# Altium schematic symbol library Analog Devices Data Converters Digital-to-Analog Converters.SchLib: 2231 symbols (part 114 of 135)
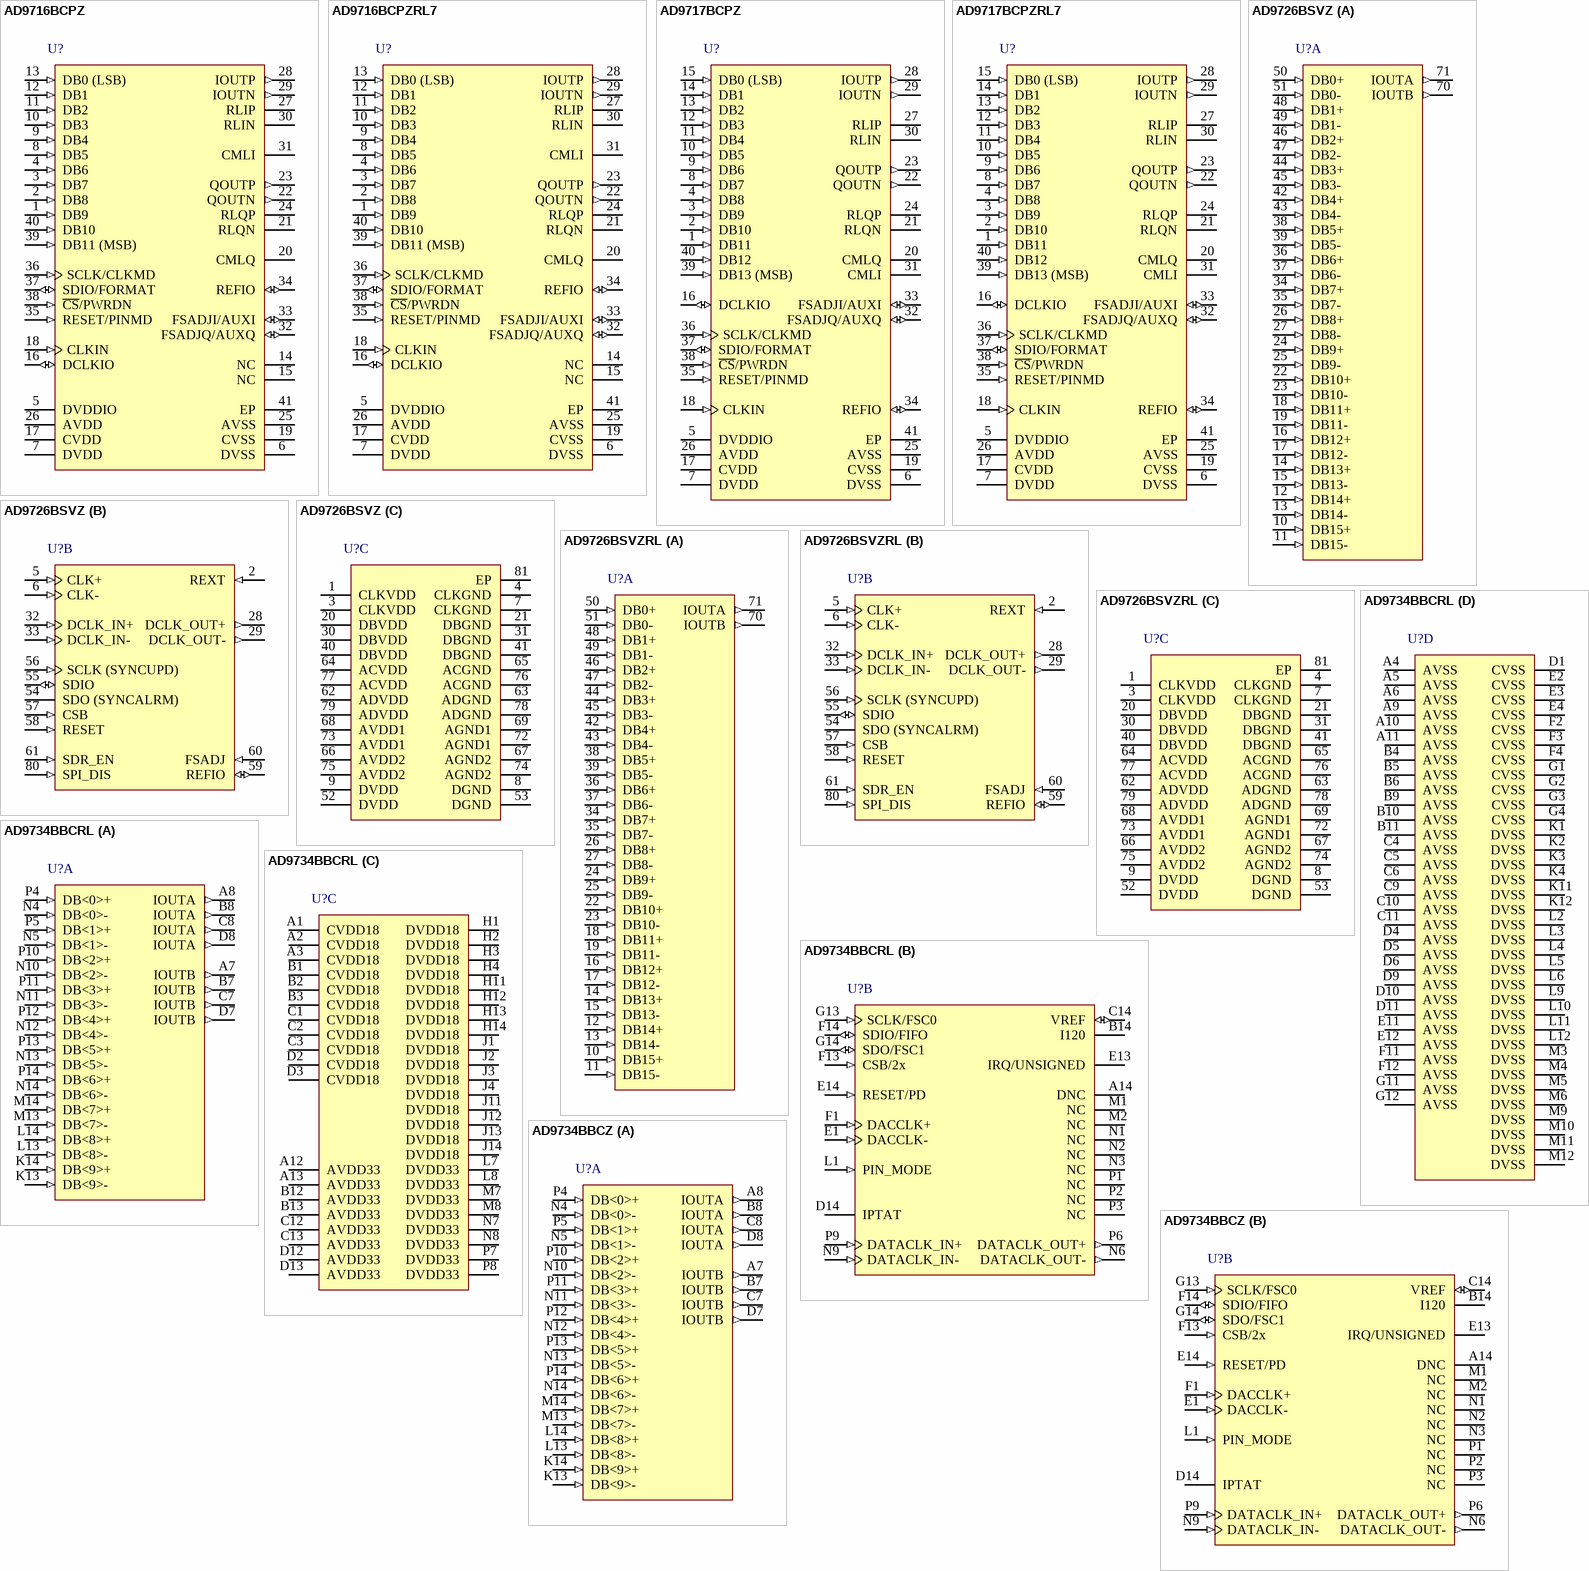
[diagram p226: symbols AD9716BCPZ to AD9734BBCZ]

## AD9717BCPZRL7
designator U?
Dual 14-Bit TxDAC, 0 to +70 degC, CP-40-1, Pb-Free, Reel; Generic Part Number: AD9717; Manufacturer: Analog Devices; PartNumber: AD9717BCPZRL7; # DAC Outputs: 2; Max V+: 3.3V; Resolution (Bits): 14; Single Supply: Yes; DatasheetVersion: Rev.A; PackageVersion: Oct-2006; PackageReference: CP-40-1; PackageDescription: 40-Pin Lead Frame Chip Scale Package [LFCSP_VQ] Very Thin Quad; Supplier 1: Digi-Key; Supplier Part Number 1: AD9717BCPZRL7-ND; Supplier 2: Newark; Supplier Part Number 2: 07P9010; Supplier 3: Mouser; Supplier Part Number 3: 584-AD9717BCPZR7; Packing: Reel; RoHS: Y; Mounting Technology: Surface Mount; Code_JEDEC: MO-220-VJJD-2; ComponentLink1Description: Manufacturer URL; ComponentLink1URL: http://www.analog.com/en/index.html; ComponentLink2Description: Datasheet; ComponentLink2URL: http://www.analog.com/static/imported-files/data_sheets/AD9714_9715_9716_9717.pdf; ComponentLink3Description: Package Specification; ComponentLink3URL: http://www.analog.com/static/imported-files/packages/PKG_PDF/LFCSP(CP)/CP_40_1.pdf; ComponentLink4Description: Product URL; ComponentLink4URL: http://www.analog.com/en/digital-to-analog-converters/da-converters/ad9717/products/product.html
footprint CP-40-1_N (QFN, 40-Leads, Body 6x6mm, Pitch 0.5mm, Thermal Pad 4.3x4.3mm, IPC Medium Density)
footprint CP-40-1_L (QFN, 40-Leads, Body 6x6mm, Pitch 0.5mm, Thermal Pad 4.3x4.3mm, IPC High Density)
footprint CP-40-1_M (QFN, 40-Leads, Body 6x6mm, Pitch 0.5mm, Thermal Pad 4.3x4.3mm, IPC Low Density)
pins: 1 DB11 (in) "Digital Input", 2 DB10 (in) "Digital Input", 3 DB9 (in) "Digital Input", 4 DB8 (in) "Digital Input", 5 DVDDIO (power) "Digital I/O Supply Voltage (1.8 V to 3.3 V Nominal).", 6 DVSS (power) "Digital Common.", 7 DVDD (power) "Digital Core Supply Voltage (1.8 V). Strap DVDD to DVDDIO at 1.8 V. If DVDDIO > 1.8 V, bypass DVDD with a 1.0 uF capacitor; however, do not otherwise connect it. The LDO should not drive external loads.", 8 DB7 (in) "Digital Input", 9 DB6 (in) "Digital Input", 10 DB5 (in) "Digital Input", 11 DB4 (in) "Digital Input", 12 DB3 (in) "Digital Input", 13 DB2 (in) "Digital Input", 14 DB1 (in) "Digital Input", 15 DB0 (LSB) (in) "Digital Input (LSB).", 16 DCLKIO (io) "Data Input/Output Clock. Clock used to qualify input data.", 17 CVDD (power) "Sampling Clock Supply Voltage (1.8 V to 3.3 V). CVDD must be >= DVDD.", 18 CLKIN (in) "LVCMOS Sampling Clock Input.", 19 CVSS (power) "Sampling Clock Supply Voltage Common.", 20 CMLQ "Q DAC Output Common-Mode Level. When the internal on chip (QRCML) is enabled, this pin is connected to the on-chip QRCML resistor. It is recommended to leave this pin unconnected. When the internal on chip (QRCML) is (See Datasheet)", 21 RLQN "Load Resistor (500 ohm) to the CMLQ Pin. For the internal load resistor to be used, this pin should be tied to QOUTN externally.", 22 QOUTN (out) "Complementary Q DAC Current Output. Full-scale current is sourced when all data bits are 0s.", 23 QOUTP (out) "Q DAC Current Output. Full-scale current is sourced when all data bits are 1s.", 24 RLQP "Load Resistor (500 ohm) to the CMLQ Pin. For the internal load resistor to be used, this pin should be tied to QOUTP externally.", 25 AVSS (power) "Analog Common.", 26 AVDD (power) "Analog Supply Voltage (1.8 V to 3.3 V).", 27 RLIP "Load Resistor (500 ohm) to the CMLI Pin. For the internal load resistor to be used, this pin should be tied to IOUTP externally.", 28 IOUTP (out) "I DAC Current Output. Full-scale current is sourced when all data bits are 1s.", 29 IOUTN (out) "Complementary I DAC Current Output. Full-scale current is sourced when all data bits are 0s.", 30 RLIN "Load Resistor (500 ohm) to the CMLI Pin. For the internal load resistor to be used, this pin should be tied to IOUTN externally.", 31 CMLI "I DAC Output Common-Mode Level. When the internal on chip (IRCML) is enabled, this pin is connected to the on-chip IRCML resistor. It is recommended to leave this pin unconnected. When the internal on chip (IRCML) is (See Datasheet)", 32 FSADJQ/AUXQ (io) "Full-Scale Current Output Adjust (FSADJQ). When the internal on chip (QRSET) is disabled, this pin is the full-scale current output adjust for Q DAC and must be connected to AVSS through a resistor (see the Theory of (See Datasheet)", 33 FSADJI/AUXI (io) "Full-Scale Current Output Adjust (FSADJI). When the internal on chip (IRSET) is disabled, this pin is the full-scale current output adjust for I DAC and must be connected to AVSS through a resistor (see the Theory of (See Datasheet)", 34 REFIO (io) "Reference Input/Output. Serves as a reference input when the internal reference is disabled. Provides a 1.0 V reference output when in internal reference mode (a 0.1 uF capacitor to AVSS is required).", 35 RESET/PINMD (in) "This pin defines the operation mode of the part. A logic low (pull-down to DVSS) sets the part in SPI mode. Pulse RESET high to reset the SPI registers to their default values. A logic high (pull-up to DVDDIO) puts the (See Datasheet)", 36 SCLK/CLKMD (in) "Clock Input for Serial Port (SCLK). In SPI mode, this pin is the clock input for the serial port. Clock Mode (CLKMD). In pin mode, CLKMD determines the phase of the internal retiming clock. When DCLKIO = CLKIN, tie it to 0. (See Datasheet)", 37 SDIO/FORMAT (io) "Serial Port Input/Output (SDIO). In SPI mode, this pin is the bidirectional data line for the serial port. Format Pin (FORMAT). In pin mode, FORMAT determines the data format of digital data. A logic low (pull-down to DVSS) (See Datasheet)", 38 ~{CS}/PWRDN (in) "Active Low Chip Select (C\S\). In SPI mode, this pin serves as the active low chip select. Power-Down (PWRDN). In pin mode, a logic high (pull-up to DVDDIO) powers down the device, except for the SPI port.", 39 DB13 (MSB) (in) "Digital Input (MSB).", 40 DB12 (in) "Digital Input", 41 EP (power) "The exposed pad is connected to AVSS and should be soldered to the ground plane. Exposed metal at the package corners is connected to this pad."

## AD9726BSVZ
designator U?
Single 16-Bit Digital-to-Analog Converter, -40 to +85 degC, SV-80-1, Pb-Free, Tray; Generic Part Number: AD9726; Manufacturer: Analog Devices; PartNumber: AD9726BSVZ; # DAC Outputs: 1; Max V+: 3.47V; Op Pwr Diss: 652mW; Resolution (Bits): 16; Settling Time: 10.5ns; Single Supply: No; DatasheetVersion: Rev.B; PackageVersion: Oct-2005; PackageReference: SV-80-1; PackageDescription: 80-Lead Thin Quad Flat Package, Exposed Pad [TQFP_EP]; Supplier 1: Digi-Key; Supplier Part Number 1: AD9726BSVZ-ND; Supplier 2: Farnell; Supplier Part Number 2: 1117883; Supplier 3: Newark; Supplier Part Number 3: 59K7323; Supplier 4: Mouser; Supplier Part Number 4: 584-AD9726BSVZ; Packing: Tray; RoHS: Y; Mounting Technology: Surface Mount; Code_JEDEC: MS-026-ADD-HD; ComponentLink1Description: Manufacturer URL; ComponentLink1URL: http://www.analog.com/en/index.html; ComponentLink2Description: Datasheet; ComponentLink2URL: http://www.analog.com/static/imported-files/data_sheets/AD9726.pdf; ComponentLink3Description: Package Specification; ComponentLink3URL: http://www.analog.com/static/imported-files/packages/3250240192292635369SV_80_1.pdf; ComponentLink4Description: Product URL; ComponentLink4URL: http://www.analog.com/en/digital-to-analog-converters/da-converters/ad9726/products/product.html
footprint SV-80-1_N (Thin QFP, 80-Leads, Body 12x12mm, Pitch 0.5mm, Thermal Pad 6x6mm, IPC Medium Density)
footprint SV-80-1_L (Thin QFP, 80-Leads, Body 12x12mm, Pitch 0.5mm, Thermal Pad 6x6mm, IPC High Density)
footprint SV-80-1_M (Thin QFP, 80-Leads, Body 12x12mm, Pitch 0.5mm, Thermal Pad 6x6mm, IPC Low Density)
part A pins: 10 DB15+ (in) "Data Bit 15 True", 11 DB15- (in) "Data Bit 15 Complement", 12 DB14+ (in) "Data Bit 14 True", 13 DB14- (in) "Data Bit 14 Complement", 14 DB13+ (in) "Data Bit 13 True", 15 DB13- (in) "Data Bit 13 Complement", 16 DB12+ (in) "Data Bit 12 True", 17 DB12- (in) "Data Bit 12 Complement", 18 DB11+ (in) "Data Bit 11 True", 19 DB11- (in) "Data Bit 11 Complement", 22 DB10+ (in) "Data Bit 10 True", 23 DB10- (in) "Data Bit 10 Complement", 24 DB9+ (in) "Data Bit 9 True", 25 DB9- (in) "Data Bit 9 Complement", 26 DB8+ (in) "Data Bit 8 True", 27 DB8- (in) "Data Bit 8 Complement", 34 DB7+ (in) "Data Bit 7 True", 35 DB7- (in) "Data Bit 7 Complement", 36 DB6+ (in) "Data Bit 6 True", 37 DB6- (in) "Data Bit 6 Complement", 38 DB5+ (in) "Data Bit 5 True", 39 DB5- (in) "Data Bit 5 Complement", 42 DB4+ (in) "Data Bit 4 True", 43 DB4- (in) "Data Bit 4 Complement", 44 DB3+ (in) "Data Bit 3 True", 45 DB3- (in) "Data Bit 3 Complement", 46 DB2+ (in) "Data Bit 2 True", 47 DB2- (in) "Data Bit 2 Complement", 48 DB1+ (in) "Data Bit 1 True", 49 DB1- (in) "Data Bit 1 Complement", 50 DB0+ (in) "Data Bit 0 True", 51 DB0- (in) "Data Bit 0 Complement", 70 IOUTB (out) "Analog Current Output Complement", 71 IOUTA (out) "Analog Current Output True"
part B pins: 2 REXT (in) "Sets Data Clock Output Drive", 5 CLK+ (in) "DAC Clock Input True", 6 CLK- (in) "DAC Clock Input Complement", 28 DCLK_OUT+ (out) "Data Clock Output True", 29 DCLK_OUT- (out) "Data Clock Output Complement", 32 DCLK_IN+ (in) "Data Clock Input True", 33 DCLK_IN- (in) "Data Clock Input Complement", 54 SDO (SYNCALRM) (hiz) "SPI Data Output (SYNCALRM)", 55 SDIO (io) "SPI Data Input/Output", 56 SCLK (SYNCUPD) (in) "SPI Clock Input (SYNCUPD)", 57 CSB (in) "SPI Chip Select Bar (Active Low)", 58 RESET (in) "Hardware Reset (Active High)", 59 REFIO (io) "Internal Reference Input/Output", 60 FSADJ (in) "Output Current Full-Scale Adjust", 61 SDR_EN (in) "Single Data Rate Mode Enable", 80 SPI_DIS (in) "Serial Port Interface Disable"
part C pins: 1 CLKVDD (power) "Clock Supply Voltage", 3 CLKVDD (power) "Clock Supply Voltage", 4 CLKGND (power) "Clock Supply Common", 7 CLKGND (power) "Clock Supply Common", 8 DGND (power) "Digital Supply Common", 9 DVDD (power) "Digital Supply Voltage", 20 DBVDD (power) "Data Bus Supply Voltage", 21 DBGND (power) "Data Bus Supply Common", 30 DBVDD (power) "Data Bus Supply Voltage", 31 DBGND (power) "Data Bus Supply Common", 40 DBVDD (power) "Data Bus Supply Voltage", 41 DBGND (power) "Data Bus Supply Common", 52 DVDD (power) "Digital Supply Voltage", 53 DGND (power) "Digital Supply Common", 62 ADVDD (power) "Analog Supply Voltage", 63 ADGND (power) "Analog Supply Common", 64 ACVDD (power) "Analog Supply Voltage", 65 ACGND (power) "Analog Supply Common", 66 AVDD2 (power) "Analog Supply Voltage", 67 AGND2 (power) "Analog Supply Common", 68 AVDD1 (power) "Analog Supply Voltage", 69 AGND1 (power) "Analog Supply Common", 72 AGND1 (power) "Analog Supply Common", 73 AVDD1 (power) "Analog Supply Voltage", 74 AGND2 (power) "Analog Supply Common", 75 AVDD2 (power) "Analog Supply Voltage", 76 ACGND (power) "Analog Supply Common", 77 ACVDD (power) "Analog Supply Voltage", 78 ADGND (power) "Analog Supply Common", 79 ADVDD (power) "Analog Supply Voltage", 81 EP (power) "Analog Ground. Serves as an electrical connection to the substrate of the die and should be connected to ground for electrical and thermal purposes."

## AD9726BSVZRL
designator U?
Single 16-Bit Digital-to-Analog Converter, -40 to +85 degC, SV-80-1, Pb-Free, Reel; Generic Part Number: AD9726; Manufacturer: Analog Devices; PartNumber: AD9726BSVZRL; # DAC Outputs: 1; Max V+: +3.47V; Op Pwr Diss: 652mW; Resolution (Bits): 16; Settling Time: 10.5ns; Single Supply: No; DatasheetVersion: Rev.B; PackageVersion: Oct-2005; PackageReference: SV-80-1; PackageDescription: 80-Lead Thin Quad Flat Package, Exposed Pad [TQFP_EP]; Supplier 1: Digi-Key; Supplier Part Number 1: AD9726BSVZRL-ND; Supplier 2: Mouser; Supplier Part Number 2: 584-AD9726BSVZR; Packing: Reel; RoHS: Y; Mounting Technology: Surface Mount; Code_JEDEC: MS-026-ADD-HD; ComponentLink1Description: Manufacturer URL; ComponentLink1URL: http://www.analog.com/en/index.html; ComponentLink2Description: Datasheet; ComponentLink2URL: http://www.analog.com/static/imported-files/data_sheets/AD9726.pdf; ComponentLink3Description: Package Specification; ComponentLink3URL: http://www.analog.com/static/imported-files/packages/3250240192292635369SV_80_1.pdf; ComponentLink4Description: Product URL; ComponentLink4URL: http://www.analog.com/en/digital-to-analog-converters/da-converters/ad9726/products/product.html
footprint SV-80-1_N (Thin QFP, 80-Leads, Body 12x12mm, Pitch 0.5mm, Thermal Pad 6x6mm, IPC Medium Density)
footprint SV-80-1_L (Thin QFP, 80-Leads, Body 12x12mm, Pitch 0.5mm, Thermal Pad 6x6mm, IPC High Density)
footprint SV-80-1_M (Thin QFP, 80-Leads, Body 12x12mm, Pitch 0.5mm, Thermal Pad 6x6mm, IPC Low Density)
part A pins: 10 DB15+ (in) "Data Bit 15 True", 11 DB15- (in) "Data Bit 15 Complement", 12 DB14+ (in) "Data Bit 14 True", 13 DB14- (in) "Data Bit 14 Complement", 14 DB13+ (in) "Data Bit 13 True", 15 DB13- (in) "Data Bit 13 Complement", 16 DB12+ (in) "Data Bit 12 True", 17 DB12- (in) "Data Bit 12 Complement", 18 DB11+ (in) "Data Bit 11 True", 19 DB11- (in) "Data Bit 11 Complement", 22 DB10+ (in) "Data Bit 10 True", 23 DB10- (in) "Data Bit 10 Complement", 24 DB9+ (in) "Data Bit 9 True", 25 DB9- (in) "Data Bit 9 Complement", 26 DB8+ (in) "Data Bit 8 True", 27 DB8- (in) "Data Bit 8 Complement", 34 DB7+ (in) "Data Bit 7 True", 35 DB7- (in) "Data Bit 7 Complement", 36 DB6+ (in) "Data Bit 6 True", 37 DB6- (in) "Data Bit 6 Complement", 38 DB5+ (in) "Data Bit 5 True", 39 DB5- (in) "Data Bit 5 Complement", 42 DB4+ (in) "Data Bit 4 True", 43 DB4- (in) "Data Bit 4 Complement", 44 DB3+ (in) "Data Bit 3 True", 45 DB3- (in) "Data Bit 3 Complement", 46 DB2+ (in) "Data Bit 2 True", 47 DB2- (in) "Data Bit 2 Complement", 48 DB1+ (in) "Data Bit 1 True", 49 DB1- (in) "Data Bit 1 Complement", 50 DB0+ (in) "Data Bit 0 True", 51 DB0- (in) "Data Bit 0 Complement", 70 IOUTB (out) "Analog Current Output Complement", 71 IOUTA (out) "Analog Current Output True"
part B pins: 2 REXT (in) "Sets Data Clock Output Drive", 5 CLK+ (in) "DAC Clock Input True", 6 CLK- (in) "DAC Clock Input Complement", 28 DCLK_OUT+ (out) "Data Clock Output True", 29 DCLK_OUT- (out) "Data Clock Output Complement", 32 DCLK_IN+ (in) "Data Clock Input True", 33 DCLK_IN- (in) "Data Clock Input Complement", 54 SDO (SYNCALRM) (hiz) "SPI Data Output (SYNCALRM)", 55 SDIO (io) "SPI Data Input/Output", 56 SCLK (SYNCUPD) (in) "SPI Clock Input (SYNCUPD)", 57 CSB (in) "SPI Chip Select Bar (Active Low)", 58 RESET (in) "Hardware Reset (Active High)", 59 REFIO (io) "Internal Reference Input/Output", 60 FSADJ (in) "Output Current Full-Scale Adjust", 61 SDR_EN (in) "Single Data Rate Mode Enable", 80 SPI_DIS (in) "Serial Port Interface Disable"
part C pins: 1 CLKVDD (power) "Clock Supply Voltage", 3 CLKVDD (power) "Clock Supply Voltage", 4 CLKGND (power) "Clock Supply Common", 7 CLKGND (power) "Clock Supply Common", 8 DGND (power) "Digital Supply Common", 9 DVDD (power) "Digital Supply Voltage", 20 DBVDD (power) "Data Bus Supply Voltage", 21 DBGND (power) "Data Bus Supply Common", 30 DBVDD (power) "Data Bus Supply Voltage", 31 DBGND (power) "Data Bus Supply Common", 40 DBVDD (power) "Data Bus Supply Voltage", 41 DBGND (power) "Data Bus Supply Common", 52 DVDD (power) "Digital Supply Voltage", 53 DGND (power) "Digital Supply Common", 62 ADVDD (power) "Analog Supply Voltage", 63 ADGND (power) "Analog Supply Common", 64 ACVDD (power) "Analog Supply Voltage", 65 ACGND (power) "Analog Supply Common", 66 AVDD2 (power) "Analog Supply Voltage", 67 AGND2 (power) "Analog Supply Common", 68 AVDD1 (power) "Analog Supply Voltage", 69 AGND1 (power) "Analog Supply Common", 72 AGND1 (power) "Analog Supply Common", 73 AVDD1 (power) "Analog Supply Voltage", 74 AGND2 (power) "Analog Supply Common", 75 AVDD2 (power) "Analog Supply Voltage", 76 ACGND (power) "Analog Supply Common", 77 ACVDD (power) "Analog Supply Voltage", 78 ADGND (power) "Analog Supply Common", 79 ADVDD (power) "Analog Supply Voltage", 81 EP (power) "Analog Ground. Serves as an electrical connection to the substrate of the die and should be connected to ground for electrical and thermal purposes."

## AD9734BBCRL
designator U?
Single 10-Bit Digital-to-Analog Converter, 1200 Msps, -40 to +85 degC, BC-160-1, Reel; Generic Part Number: AD9734; Manufacturer: Analog Devices; PartNumber: AD9734BBCRL; # DAC Outputs: 1; Max V+: 3.47V; Op Pwr Diss: 550mW; Resolution (Bits): 10; Single Supply: Yes; DatasheetVersion: Rev.A; PackageVersion: 012006-0; PackageReference: BC-160-1; PackageDescription: 160-Ball Chip Scale Package Ball Grid Array [CSP_BGA]; Packing: Reel; RoHS: N; Mounting Technology: Surface Mount; Code_JEDEC: MO-205-AE; ComponentLink1Description: Manufacturer URL; ComponentLink1URL: http://www.analog.com/en/index.html; ComponentLink2Description: Datasheet; ComponentLink2URL: http://www.analog.com/static/imported-files/data_sheets/AD9734_9735_9736.pdf; ComponentLink3Description: Package Specification; ComponentLink3URL: http://www.analog.com/static/imported-files/packages/31243239490197BC_160_1.pdf; ComponentLink4Description: Product URL; ComponentLink4URL: http://www.analog.com/en/digital-to-analog-converters/da-converters/ad9734/products/product.html
footprint BC-160-1 (BGA, 160-Leads, Body 12x12mm, Pitch 0.8mm)
part A pins: A7 IOUTB (out) "DAC Negative Output. 10 mA to 30 mA full-scale output current.", A8 IOUTA (out) "DAC Positive Output. 10 mA to 30 mA full-scale output current.", B7 IOUTB (out) "DAC Negative Output. 10 mA to 30 mA full-scale output current.", B8 IOUTA (out) "DAC Positive Output. 10 mA to 30 mA full-scale output current.", C7 IOUTB (out) "DAC Negative Output. 10 mA to 30 mA full-scale output current.", C8 IOUTA (out) "DAC Positive Output. 10 mA to 30 mA full-scale output current.", D7 IOUTB (out) "DAC Negative Output. 10 mA to 30 mA full-scale output current.", D8 IOUTA (out) "DAC Positive Output. 10 mA to 30 mA full-scale output current.", K13 DB<9>- (in) "Negative Data Input Bit 9 (MSB). Conforms to IEEE-1596 reduced range link.", K14 DB<9>+ (in) "Positive Data Input Bit 9 (MSB). Conforms to IEEE-1596 reduced range link.", L13 DB<8>- (in) "Negative Data Input Bit 8. Conforms to IEEE-1596 reduced range link.", L14 DB<8>+ (in) "Positive Data Input Bit 8. Conforms to IEEE-1596 reduced range link.", M13 DB<7>- (in) "Negative Data Input Bit 7. Conforms to IEEE-1596 reduced range link.", M14 DB<7>+ (in) "Positive Data Input Bit 7. Conforms to IEEE-1596 reduced range link.", N4 DB<0>- (in) "Negative Data Input Bit 0 (LSB). Conforms to IEEE-1596 reduced range link.", N5 DB<1>- (in) "Negative Data Input Bit 1. Conforms to IEEE-1596 reduced range link.", N10 DB<2>- (in) "Negative Data Input Bit 2. Conforms to IEEE-1596 reduced range link.", N11 DB<3>- (in) "Negative Data Input Bit 3. Conforms to IEEE-1596 reduced range link.", N12 DB<4>- (in) "Negative Data Input Bit 4. Conforms to IEEE-1596 reduced range link.", N13 DB<5>- (in) "Negative Data Input Bit 5. Conforms to IEEE-1596 reduced range link.", N14 DB<6>- (in) "Negative Data Input Bit 6. Conforms to IEEE-1596 reduced range link.", P4 DB<0>+ (in) "Positive Data Input Bit 0 (LSB). Conforms to IEEE-1596 reduced range link.", P5 DB<1>+ (in) "Positive Data Input Bit 1. Conforms to IEEE-1596 reduced range link.", P10 DB<2>+ (in) "Positive Data Input Bit 2. Conforms to IEEE-1596 reduced range link.", P11 DB<3>+ (in) "Positive Data Input Bit 3. Conforms to IEEE-1596 reduced range link.", P12 DB<4>+ (in) "Positive Data Input Bit 4. Conforms to IEEE-1596 reduced range link.", P13 DB<5>+ (in) "Positive Data Input Bit 5. Conforms to IEEE-1596 reduced range link.", P14 DB<6>+ (in) "Positive Data Input Bit 6. Conforms to IEEE-1596 reduced range link."
part B pins: A14 DNC "Do Not Connect.", B14 I120 "Nominal 1.2 V Reference. Tie to analog ground via 10 kohm resistor to generate a 120 uA reference current.", C14 VREF (io) "Band Gap Voltage Reference I/O. Tie to analog ground via 1 nF capacitor; output impedance approximately 5 kohm.", D14 IPTAT "Factory Test Pin. Output current, proportional to absolute temperature, is approximately 10 uA at 25degreesC with a slope of approximately 20 nA/degreesC.", E1 DACCLK- (in) "Negative DAC Clock Input (DACCLK).", E13 IRQ/UNSIGNED (oc) "If PIN_MODE = 0, IRQ: Active low open-drain interrupt request output, pull up to DVDD33 with 10 kohm resistor. If PIN_MODE = 1, UNSIGNED: Digital input pin where 0 = twos complement input data format, 1 = unsigned.", E14 RESET/PD (in) "If PIN_MODE = 0, RESET: 1 resets the AD9734. If PIN_MODE = 1, PD: 1 puts the AD9734 in the power-down state.", F1 DACCLK+ (in) "Positive DAC Clock Input (DACCLK).", F13 CSB/2x (in) "See the Serial Peripheral Interface section and the Pin Mode Operation section for pin description.", F14 SDIO/FIFO (io) "See the Pin Mode Operation section for pin description.", G13 SCLK/FSC0 (in) "See the Pin Mode Operation section for pin description.", G14 SDO/FSC1 (io) "See the Pin Mode Operation section for pin description.", L1 PIN_MODE (in) "0 = SPI Mode. SPI is enabled. 1 = PIN Mode. SPI is disabled; direct pin control.", M1 NC "No Connect.", M2 NC "No Connect.", N1 NC "No Connect.", N2 NC "No Connect.", N3 NC "No Connect.", N6 DATACLK_OUT- (out) "Negative Data Output Clock. Conforms to IEEE-1596 reduced range link.", N9 DATACLK_IN- (in) "Negative Data Input Clock. Conforms to IEEE-1596 reduced range link.", P1 NC "No Connect.", P2 NC "No Connect.", P3 NC "No Connect.", P6 DATACLK_OUT+ (out) "Positive Data Output Clock. Conforms to IEEE-1596 reduced range link.", P9 DATACLK_IN+ (in) "Positive Data Input Clock. Conforms to IEEE-1596 reduced range link."
part C pins: A1 CVDD18 (power) "1.8 V Clock Supply.", A2 CVDD18 (power) "1.8 V Clock Supply.", A3 CVDD18 (power) "1.8 V Clock Supply.", A12 AVDD33 (power) "3.3 V Analog Supply.", A13 AVDD33 (power) "3.3 V Analog Supply.", B1 CVDD18 (power) "1.8 V Clock Supply.", B2 CVDD18 (power) "1.8 V Clock Supply.", B3 CVDD18 (power) "1.8 V Clock Supply.", B12 AVDD33 (power) "3.3 V Analog Supply.", B13 AVDD33 (power) "3.3 V Analog Supply.", C1 CVDD18 (power) "1.8 V Clock Supply.", C2 CVDD18 (power) "1.8 V Clock Supply.", C3 CVDD18 (power) "1.8 V Clock Supply.", C12 AVDD33 (power) "3.3 V Analog Supply.", C13 AVDD33 (power) "3.3 V Analog Supply.", D2 CVDD18 (power) "1.8 V Clock Supply.", D3 CVDD18 (power) "1.8 V Clock Supply.", D12 AVDD33 (power) "3.3 V Analog Supply.", D13 AVDD33 (power) "3.3 V Analog Supply.", H1 DVDD18 (power) "1.8 V Digital Supply.", H2 DVDD18 (power) "1.8 V Digital Supply.", H3 DVDD18 (power) "1.8 V Digital Supply.", H4 DVDD18 (power) "1.8 V Digital Supply.", H11 DVDD18 (power) "1.8 V Digital Supply.", H12 DVDD18 (power) "1.8 V Digital Supply.", H13 DVDD18 (power) "1.8 V Digital Supply.", H14 DVDD18 (power) "1.8 V Digital Supply.", J1 DVDD18 (power) "1.8 V Digital Supply.", J2 DVDD18 (power) "1.8 V Digital Supply.", J3 DVDD18 (power) "1.8 V Digital Supply.", J4 DVDD18 (power) "1.8 V Digital Supply.", J11 DVDD18 (power) "1.8 V Digital Supply.", J12 DVDD18 (power) "1.8 V Digital Supply.", J13 DVDD18 (power) "1.8 V Digital Supply.", J14 DVDD18 (power) "1.8 V Digital Supply.", L7 DVDD33 (power) "3.3 V Digital Supply.", L8 DVDD33 (power) "3.3 V Digital Supply.", M7 DVDD33 (power) "3.3 V Digital Supply.", M8 DVDD33 (power) "3.3 V Digital Supply.", N7 DVDD33 (power) "3.3 V Digital Supply.", N8 DVDD33 (power) "3.3 V Digital Supply.", P7 DVDD33 (power) "3.3 V Digital Supply.", P8 DVDD33 (power) "3.3 V Digital Supply."
part D pins: A4 AVSS (power) "Analog Supply Ground.", A5 AVSS (power) "Analog Supply Ground.", A6 AVSS (power) "Analog Supply Ground.", A9 AVSS (power) "Analog Supply Ground.", A10 AVSS (power) "Analog Supply Ground.", A11 AVSS (power) "Analog Supply Ground.", B4 AVSS (power) "Analog Supply Ground.", B5 AVSS (power) "Analog Supply Ground.", B6 AVSS (power) "Analog Supply Ground.", B9 AVSS (power) "Analog Supply Ground.", B10 AVSS (power) "Analog Supply Ground.", B11 AVSS (power) "Analog Supply Ground.", C4 AVSS (power) "Analog Supply Ground.", C5 AVSS (power) "Analog Supply Ground.", C6 AVSS (power) "Analog Supply Ground.", C9 AVSS (power) "Analog Supply Ground.", C10 AVSS (power) "Analog Supply Ground.", C11 AVSS (power) "Analog Supply Ground.", D1 CVSS (power) "Clock Supply Ground.", D4 AVSS (power) "Analog Supply Ground.", D5 AVSS (power) "Analog Supply Ground.", D6 AVSS (power) "Analog Supply Ground.", D9 AVSS (power) "Analog Supply Ground.", D10 AVSS (power) "Analog Supply Ground.", D11 AVSS (power) "Analog Supply Ground.", E2 CVSS (power) "Clock Supply Ground.", E3 CVSS (power) "Clock Supply Ground.", E4 CVSS (power) "Clock Supply Ground.", E11 AVSS (power) "Analog Supply Ground Shield. Tie to AVSS at the DAC.", E12 AVSS (power) "Analog Supply Ground Shield. Tie to AVSS at the DAC.", F2 CVSS (power) "Clock Supply Ground.", F3 CVSS (power) "Clock Supply Ground.", F4 CVSS (power) "Clock Supply Ground.", F11 AVSS (power) "Analog Supply Ground Shield. Tie to AVSS at the DAC.", F12 AVSS (power) "Analog Supply Ground Shield. Tie to AVSS at the DAC.", G1 CVSS (power) "Clock Supply Ground.", G2 CVSS (power) "Clock Supply Ground.", G3 CVSS (power) "Clock Supply Ground.", G4 CVSS (power) "Clock Supply Ground.", G11 AVSS (power) "Analog Supply Ground Shield. Tie to AVSS at the DAC.", G12 AVSS (power) "Analog Supply Ground Shield. Tie to AVSS at the DAC.", K1 DVSS (power) "Digital Supply Ground.", K2 DVSS (power) "Digital Supply Ground.", K3 DVSS (power) "Digital Supply Ground.", K4 DVSS (power) "Digital Supply Ground.", K11 DVSS (power) "Digital Supply Ground.", K12 DVSS (power) "Digital Supply Ground.", L2 DVSS (power) "Digital Supply Ground.", L3 DVSS (power) "Digital Supply Ground.", L4 DVSS (power) "Digital Supply Ground.", L5 DVSS (power) "Digital Supply Ground.", L6 DVSS (power) "Digital Supply Ground.", L9 DVSS (power) "Digital Supply Ground.", L10 DVSS (power) "Digital Supply Ground.", L11 DVSS (power) "Digital Supply Ground.", L12 DVSS (power) "Digital Supply Ground.", M3 DVSS (power) "Digital Supply Ground.", M4 DVSS (power) "Digital Supply Ground.", M5 DVSS (power) "Digital Supply Ground.", M6 DVSS (power) "Digital Supply Ground.", M9 DVSS (power) "Digital Supply Ground.", M10 DVSS (power) "Digital Supply Ground.", M11 DVSS (power) "Digital Supply Ground.", M12 DVSS (power) "Digital Supply Ground."